# Altium schematic symbol library lib_datalogger.SchLib: 1246 symbols (part 16 of 16)
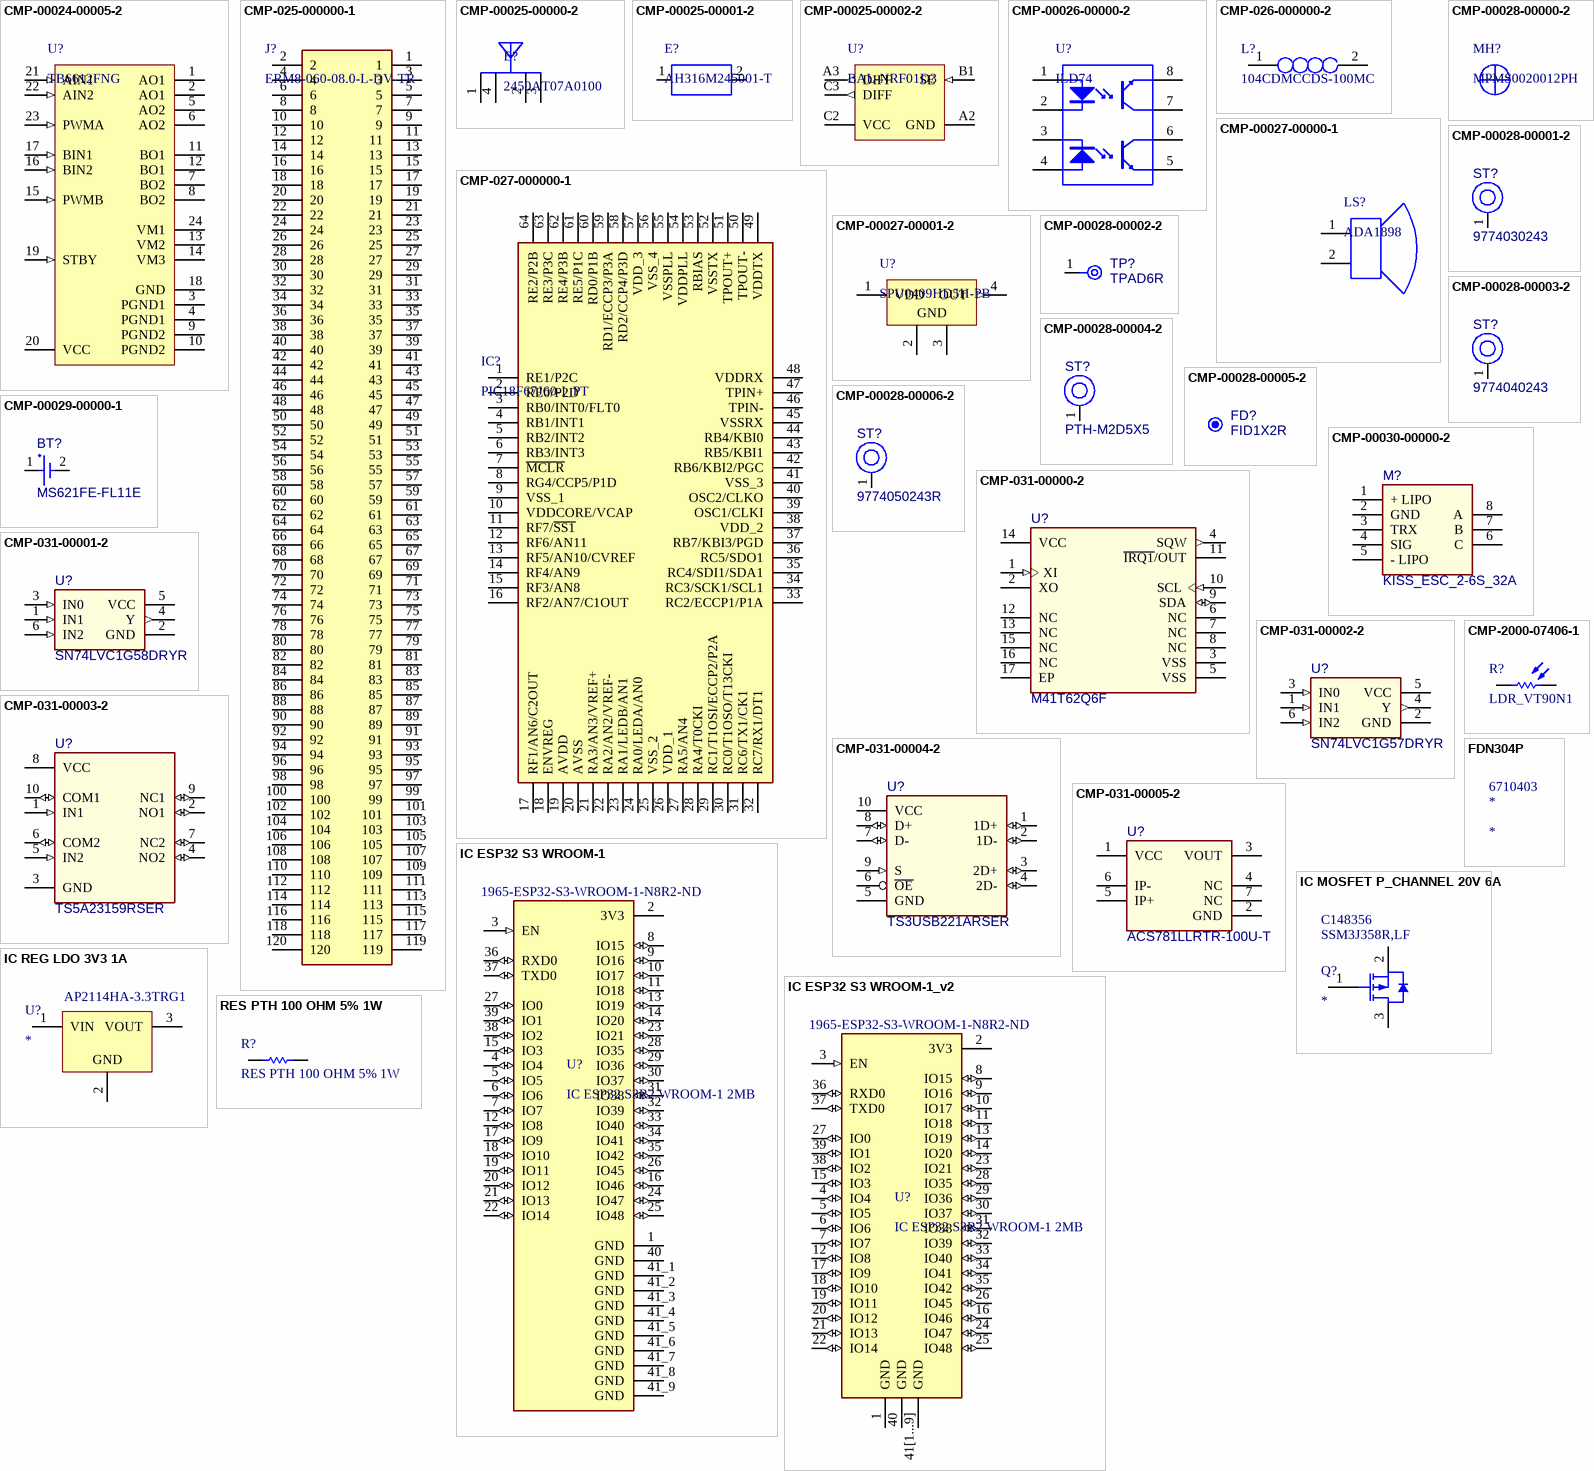
[diagram p58: symbols CMP-00024-00005-2 to RES PTH 100 OHM 5% 1W]

## IC ESP32 S3 WROOM-1
designator U?, comment IC ESP32 S3R2 WROOM-1 2MB  Supplier Part Number 1: 1965-ESP32-S3-WROOM-1-N8R2-ND
SMD Module, ESP32-S3R2 With 2 mb; Manufacturer Part Number: ESP32-S3-WROOM-1-N8R2; MF: Espressif Systems; SnapEDA_Link: https://www.snapeda.com/parts/ESP32-S3-WROOM-1U/Espressif+Systems/view-part/?ref=snap; Availability: Not in stock; Package: Package; Price: None; Value: *; Check_prices: https://www.snapeda.com/parts/ESP32-S3-WROOM-1U/Espressif+Systems/view-part/?ref=eda; Supplier 1: Digi-Key; Manufacturer: Espressif Systems; RoHS: No; Category: Uncategorized; Stock 1: 659; Pricing 1: 1=3,63000 (USD)
footprint ESP32_S3_WROOM_1 (Footprint for ESP32-S3-WROOM-1 module)
pins: 1 GND (power), 2 3V3 (power), 3 EN (in), 4 IO4 (io), 5 IO5 (io), 6 IO6 (io), 7 IO7 (io), 8 IO15 (io), 9 IO16 (io), 10 IO17 (io), 11 IO18 (io), 12 IO8 (io), 13 IO19 (io), 14 IO20 (io), 15 IO3 (io), 16 IO46 (io), 17 IO9 (io), 18 IO10 (io), 19 IO11 (io), 20 IO12 (io), 21 IO13 (io), 22 IO14 (io), 23 IO21 (io), 24 IO47 (io), 25 IO48 (io), 26 IO45 (io), 27 IO0 (io), 28 IO35 (io), 29 IO36 (io), 30 IO37 (io), 31 IO38 (io), 32 IO39 (io), 33 IO40 (io), 34 IO41 (io), 35 IO42 (io), 36 RXD0 (io), 37 TXD0 (io), 38 IO2 (io), 39 IO1 (io), 40 GND (power), 41_1 GND (power), 41_2 GND (power), 41_3 GND (power), 41_4 GND (power), 41_5 GND (power), 41_6 GND (power), 41_7 GND (power), 41_8 GND (power), 41_9 GND (power)

## IC ESP32 S3 WROOM-1_v2
designator U?, comment IC ESP32 S3R2 WROOM-1 2MB  Supplier Part Number 1: 1965-ESP32-S3-WROOM-1-N8R2-ND
SMD Module, ESP32-S3R2 With 2 mb; Manufacturer Part Number: ESP32-S3-WROOM-1-N8R2; MF: Espressif Systems; SnapEDA_Link: https://www.snapeda.com/parts/ESP32-S3-WROOM-1U/Espressif+Systems/view-part/?ref=snap; Availability: Not in stock; Package: Package; Price: None; Value: *; Check_prices: https://www.snapeda.com/parts/ESP32-S3-WROOM-1U/Espressif+Systems/view-part/?ref=eda; Supplier 1: Digi-Key; Manufacturer: Espressif Systems; RoHS: No; Category: Uncategorized; Stock 1: 659; Pricing 1: 1=3,63000 (USD)
footprint ESP32_S3_WROOM_1 (Footprint for ESP32-S3-WROOM-1 module)
pins: 1 GND (power), 2 3V3 (power), 3 EN (in), 4 IO4 (io), 5 IO5 (io), 6 IO6 (io), 7 IO7 (io), 8 IO15 (io), 9 IO16 (io), 10 IO17 (io), 11 IO18 (io), 12 IO8 (io), 13 IO19 (io), 14 IO20 (io), 15 IO3 (io), 16 IO46 (io), 17 IO9 (io), 18 IO10 (io), 19 IO11 (io), 20 IO12 (io), 21 IO13 (io), 22 IO14 (io), 23 IO21 (io), 24 IO47 (io), 25 IO48 (io), 26 IO45 (io), 27 IO0 (io), 28 IO35 (io), 29 IO36 (io), 30 IO37 (io), 31 IO38 (io), 32 IO39 (io), 33 IO40 (io), 34 IO41 (io), 35 IO42 (io), 36 RXD0 (io), 37 TXD0 (io), 38 IO2 (io), 39 IO1 (io), 40 GND (power), 41[1...9] GND (power)

## IC MOSFET P_CHANNEL 20V 6A
designator Q?  Supplier Part Number 1: SSM3J358R,LF  Supplier Part Number 2: C148356
Small Low ON Resistance MOSFET P-Channel 20V 6A 3-Pin SOT-23F T/R; Manufacturer: Toshiba; ComponentLink1URL: https://datasheet.ciiva.com/30023/dmp31d0u-30023794.pdf?src-supplier=Avnet; ComponentLink1Description: https://datasheet.ciiva.com/30023/dmp31d0u-30023794.pdf?src-supplier=Avnet; Supplier 1: Avnet; Manufacturer Part Number: SSM3J358R,LF; RoHS: No; Category: MOSFETs; Stock 1: 12000; Pricing 1: 3000=0,10175, 6000=0,09625, 12000=0,09075, 18000=0,08525, 24000=0,07975, 30000=0,07425, 300000=0,06875 (USD); Supplier 2: LCSC
footprint SOT-23
pins: 1 GATE, 2 SOURCE, 3 DRAIN

## IC REG LDO 3V3 1A
designator U?  Manufacturer Part Number: AP2114HA-3.3TRG1
IC REG LDO 3.3V 1A SOT223; Manufacturer: Diodes; Dropout Voltage: 450mV; Number of Regulators: 1; Polarity: Positive; Quiescent Current: 90uA; Accuracy: 1.5%; Min Input Voltage: 2.5V; Max Input Voltage: 6V; Output Type: Fixed; Supplier 1: Digi-Key; RoHS: Yes; Category: Voltage Regulators - Linear; Stock 1: 1890; Pricing 1: 1=0,39000, 10=0,31700, 25=0,29000, 100=0,21570, 250=0,19552, 500=0,16180, 1000=0,12135 (USD); Mount: Surface Mount; Case/Package: TO-261-4; Number of Pins: 3; Contact Plating: Tin; Min Operating Temperature: -40°C; Max Operating Temperature: 85°C; Packaging: Tape and Reel; Package Quantity: 4000; Output Voltage: 3.3V; Output Current: 1A; Max Output Current: 1A; Number of Outputs: 1; RoHS Compliant: Yes; ComponentLink1URL: https://datasheet.ciiva.com/29568/ap2114-29568886.pdf?src-supplier=Digi-Key; ComponentLink1Description: https://datasheet.ciiva.com/29568/ap2114-29568886.pdf?src-supplier=Digi-Key; Supplier Part Number 1: AP2114HA-3.3TRG1DICT-ND
footprint SOT-223
pins: 1 VIN (power), 2 GND (power), 3 VOUT (power)

## RES PTH 100 OHM 5% 1W
designator R?
RES PTH 100 OHM 5% 1W / General Type Wirewound Resistor 100Ohm 1W 5% Axial T/R; Manufacturer: Yageo; Manufacturer Part Number: KNP100JR-52-100R; Resistance: 100R; Supplier 1: Arrow Electronics; RoHS: Yes; Description: General Type Wirewound Resistor 100Ohm 1W 5% Axial T/R; Category: Through-Hole Resistors; Stock 1: 743; Pricing 1: 1=0,07520, 10=0,05340, 25=0,04990, 100=0,04650, 250=0,04290, 500=0,03950 (USD); Case/Package: Axial; Min Operating Temperature: -40°C; Max Operating Temperature: 200°C; Tolerance: 5%; Packaging: Tape and Reel; Resistor Type: Wirewound; Number of Terminations: 2; Max Power Dissipation: 1W; Package Quantity: 1; Series: KNP; Features: Flame Retardant Coating; Length: 0.453inch; RoHS Compliant: Yes; Lead Free: Lead Free; ComponentLink1URL: https://datasheet.ciiva.com/2712/yageolr-knp-2013-2712454.pdf?src-supplier=Digi-Key; ComponentLink1Description: https://datasheet.ciiva.com/2712/yageolr-knp-2013-2712454.pdf?src-supplier=Digi-Key; ComponentLink2URL: https://datasheet.ciiva.com/2712/yageolr-knp-2013-2712455.pdf?src-supplier=Digi-Key; ComponentLink2Description: https://datasheet.ciiva.com/2712/yageolr-knp-2013-2712455.pdf?src-supplier=Digi-Key; Supplier Part Number 1: KNP100JR-52-100R
footprint RESA60-630X240-2 (Axial Resistor, 2-Leads, Dia 2.4mm, Body Length 6.3mm)
pins: 1, 2